# Altium footprint library TranDangKhoa-LIB.PcbLib: 1435 footprints (part 57 of 90)
Each footprint in its own frame and in the unit in brackets; x right, y up, seen from the top. Pads: shape width x height; smd on the part's side, far side on the other; paste and mask are expansions set on the pad; w line width, h text height; cw(c..) or ccw(c..) is an arc to the next point about the centre after c.
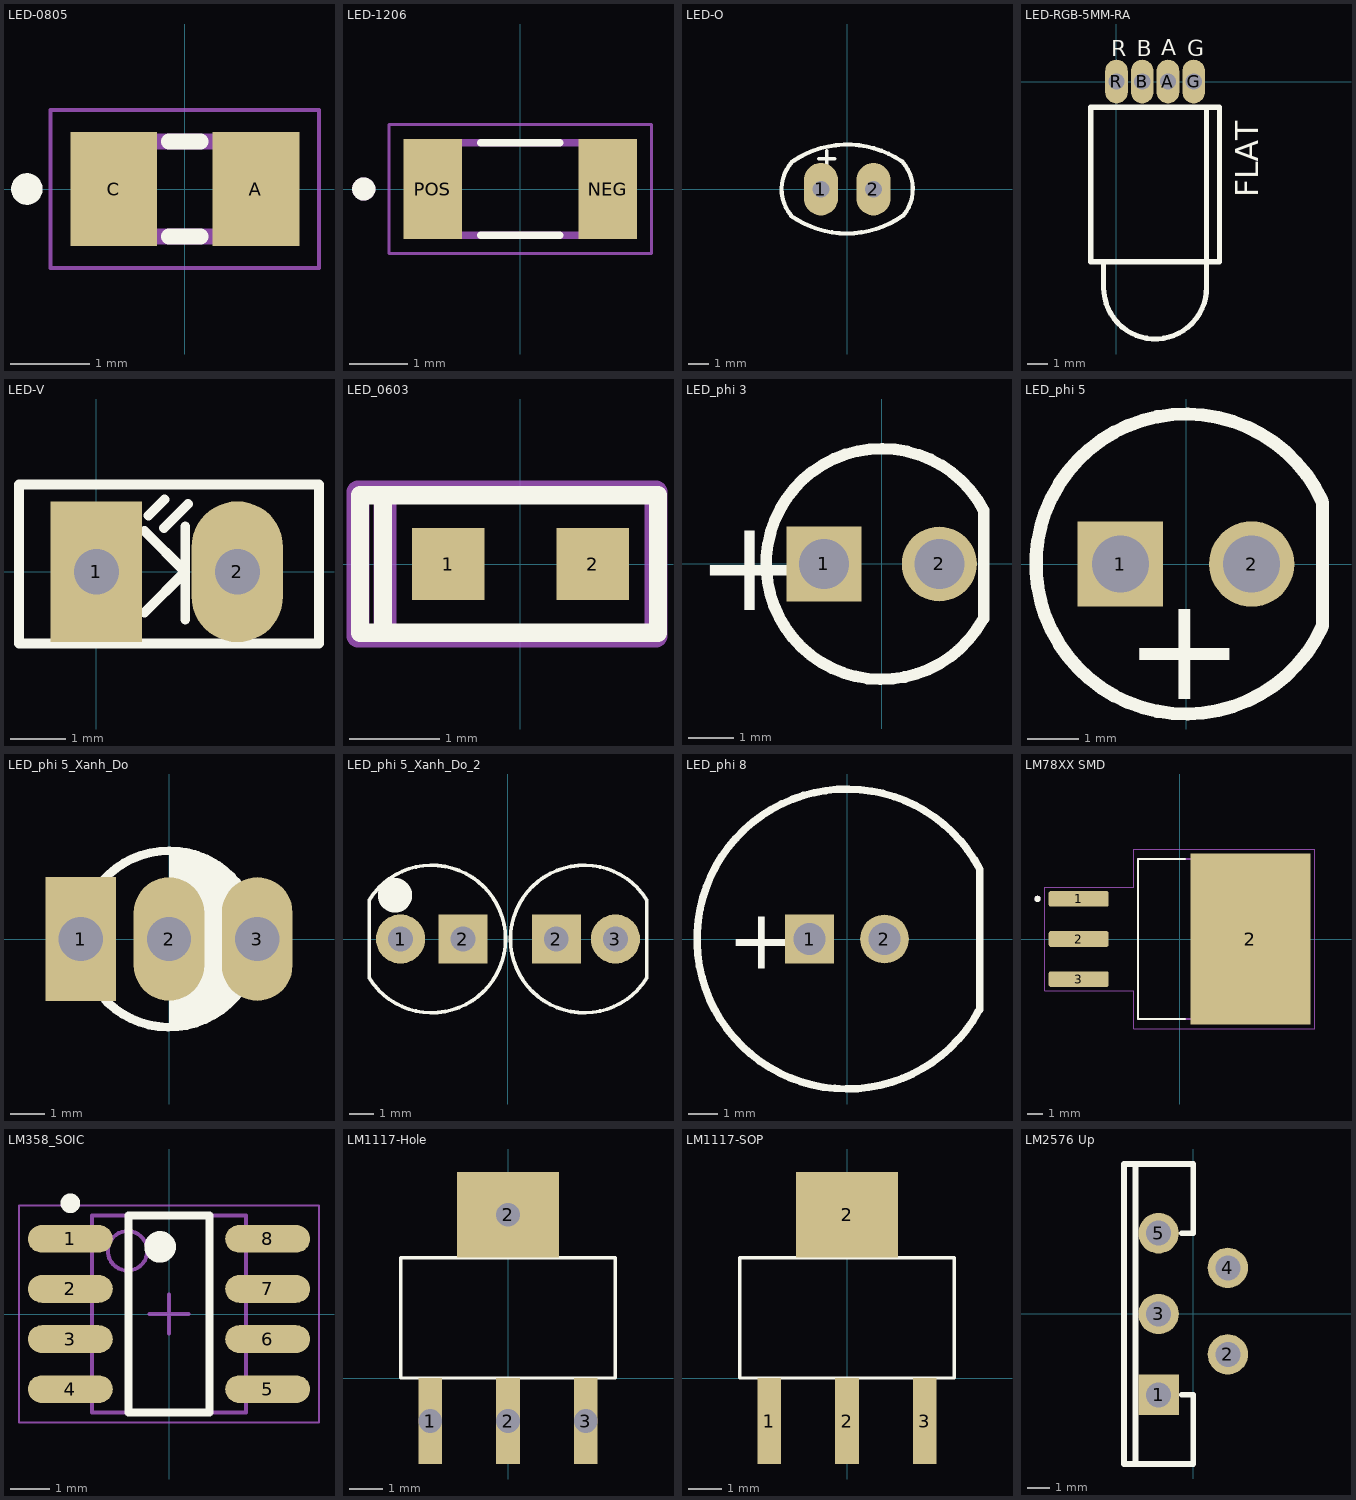
[diagram p56: the footprints below, top view; thin cyan lines are the x and y axes]

## LED-0805 [mm]
pads (2):
  rect 1.1x1.45 smd: A(0.9,0) C(-0.9,0)
Top Overlay:
  circle w0.2: c-2,0 r0.1
  lines w0.2: -0.2,-0.6 0.2,-0.6 ; -0.2,0.6 0.2,0.6
Mechanical 13:
  region: 1,-0.6 0.5,-0.6 0.5,0.6 1,0.6
  region: -0.5,-0.6 -1,-0.6 -1,0.6 -0.5,0.6
  lines w0.2: -1,-0.6 -1,0.6 1,0.6 1,-0.6 -1,-0.6
Mechanical 15:
  lines w0.05: -1.7,-1 -1.7,1 1.7,1 1.7,-1 -1.7,-1
3D body "step_temp.STEP": height 0.9, standoff 0, extent -1,-0.65 1,0.65

## LED-1206 [mm]
height 1.2
pads (2):
  rect 1.01x1.73 smd: NEG(1.51,0) POS(-1.51,0)
Top Overlay:
  circle w0.2: c-2.7,0 r0.1
  lines w0.127: -0.685,-0.8 0.685,-0.8 ; -0.685,0.8 0.685,0.8
Mechanical 13:
  circle w0.2: c-2.7,0 r0.1
  lines w0.127: -1.6,-0.8 1.6,-0.8 1.6,0.8 -1.6,0.8 -1.6,-0.8
Mechanical 15:
  lines w0.05: -2.265,-1.115 2.265,-1.115 2.265,1.115 -2.265,1.115 -2.265,-1.115
3D body "step_temp.STEP": height 1.2, standoff 0, extent -1.6,-0.8 1.6,0.8

## LED-O [mil] "LED 2 PIN,  Ovan Only colour, pin to pin 110mil"
height 300
pads (2):
  oval 65x100 hole 32: 1(-50,0) 2(50,0)
Top Overlay:
  lines w7: -54,58 -24,58 ; -39,43 -39,73
  lines w8: -106.82,-49.85 cw(c-47,0) -104.5,52.5 ; -106.38,-51.11 ccw(c-0.81,100.81) 104.97,-50.96 ; -102.83,53.79 cw(c0,-100) 103.93,53.04 ; 104.5,52.5 cw(c47,0) 106.82,-49.85

## LED-RGB-5MM-RA [mil] "LED RGB Right Angle 5mm"
height 5
pads (4):
  oval 44x85 hole 31.5 paste-99999 mask+0: A(100,0) B(50,0) G(150,0) R(0,0)
Top Overlay:
  lines w10: -25,-350 -25,-400 ccw(c75,-400) 175,-400 175,-350 175,-50 ; -50,-350 200,-350 200,-50 -50,-50 -50,-350
  text "G" at 137.8,49.21 h31.5
  text "A" at 86.61,51.18 h31.5
  text "FLAT" at 275,-225 h45
  text "R" at -9.84,49.21 h31.5
  text "B" at 39.37,49.21 h31.5

## LED-V [mil] "LED 2 PIN, Rectang Only colour"
height 300
pads (2):
  rect 65x100 hole 32: 1(0,0)
  oval 65x100 hole 32: 2(100,0)
Top Overlay:
  lines w7: 34,-29 63,0 34,29 ; 37,40 48.3,51.3 ; 48,31 65,48 ; 63,-34 63,32 ; -55,-51 -55,62 158,62 158,-51 -55,-51

## LED_0603 [mm]
pads (2):
  rect 0.8x0.8 smd: 1(-0.8,0) 2(0.8,0)
Top Overlay:
  lines w0.2: -1.524,-0.762 -1.524,0.762 ; -1.778,-0.762 -1.778,0.762 1.524,0.762 1.524,-0.762 -1.778,-0.762
Mechanical 16:
  lines w0.254: -1.5,-0.8 -1.5,0.8 ; -1.8,-0.8 1.5,-0.8 1.5,0.8 -1.8,0.8 -1.8,-0.8
Mechanical 29:
  text ".Designator" at 0.5,0.3 h0.6
3D body: height 0.66, standoff 0.5, extent -0.2,-0.2 0.2,0.2
3D body "LED SMD 0603.step": height 0.65, standoff 0, extent -0.85,-0.4 0.85,0.4

## LED_phi 3 [mil] "LED phi 3"
height 236.22
pads (2):
  rect 65x65 hole 43.31: 1(-50,0)
  round 65 hole 43.31: 2(50,0)
Top Overlay:
  lines w10: 87.62,-48.19 cw(c0,0) 88.49,46.58 88.49,-47.32
  text "+" at -160,-40 h80

## LED_phi 5 [mil] "LED phi 5mm"
height 649.61
pads (2):
  rect 65x65 hole 43.31: 1(-50,0)
  round 65 hole 43.31: 2(50,0)
Top Overlay:
  lines w10: 103.49,-48.23 cw(c0,0) 103.49,48.23 ; 104,-47 104,46.9
  text "+" at -47,-103 h80

## LED_phi 5_Xanh_Do [mil] "LED phi 5mm 2 mau xanh va do"
height 314.96
pads (3):
  rect 80x140 hole 50: 1(-100,0)
  oval 80x140 hole 50: 2(0,0) 3(100,0)
Top Overlay:
  region: 0,100 7,93 27,93
  region: 0,100 0,-100 25,-100 35,-90 50,-90 87.62,-52.38 87.62,45.71 88.49,46.58 88.49,51.51 70.71,69.29 70.71,70.71 69.29,70.71 47,93 7,93
  lines w10: 0,100 cw(c0,0) 70.71,70.71 ; 87.62,-48.19 cw(c0,0) 88.49,46.58 88.49,-47.32

## LED_phi 5_Xanh_Do_2 [mm] "LED phi 5mm 2 mau xanh va do doc lap"
height 8
pads (4):
  round 2 hole 1: 1(-4.37,0) 3(4.37,0)
  rect 2x2 hole 1: 2(-1.83,0) 2(1.97,0)
Top Overlay:
  circle w1: c-4.594,1.778 r0.2
  lines w0.15: -5.64,-1.6 -5.64,1.575 ; -5.638,-1.599 ccw(c-3.1,0) -5.638,1.599 ; 5.638,-1.575 5.638,1.6 ; 5.638,-1.599 cw(c3.1,0) 5.638,1.599

## LED_phi 8 [mil] "LED phi 8mm"
height 649.61
pads (2):
  rect 65x65 hole 43.31: 1(-50,0)
  round 65 hole 43.31: 2(50,0)
Top Overlay:
  lines w10: 175.24,-96.38 cw(c0,0) 176.98,93.15 176.98,-94.64
  text "+" at -160,-40 h80

## LM78XX SMD [mm]
pads (4):
  rrect25% 3.79x0.99 smd: 1(-6.4,2.54) 2(-6.4,0) 3(-6.4,-2.54)
  rect 7.62x10.84 smd paste-6: 2(4.48,0)
Top Overlay:
  circle w0.2: c-9,2.54 r0.1
  lines w0.127: 0.35,-5.08 -2.648,-5.08 -2.648,5.08 0.35,5.08
Top Paste:
  region: 5.205,0.27 3.755,0.27 3.755,1.53 5.205,1.53
  region: 5.205,2.07 3.755,2.07 3.755,3.33 5.205,3.33
  region: 5.205,3.87 3.755,3.87 3.755,5.13 5.205,5.13
  region: 5.205,-1.53 3.755,-1.53 3.755,-0.27 5.205,-0.27
  region: 5.205,-3.33 3.755,-3.33 3.755,-2.07 5.205,-2.07
  region: 5.205,-5.13 3.755,-5.13 3.755,-3.87 5.205,-3.87
  region: 7.745,0.27 6.295,0.27 6.295,1.53 7.745,1.53
  region: 7.745,2.07 6.295,2.07 6.295,3.33 7.745,3.33
  region: 7.745,3.87 6.295,3.87 6.295,5.13 7.745,5.13
  region: 7.745,-1.53 6.295,-1.53 6.295,-0.27 7.745,-0.27
  region: 7.745,-3.33 6.295,-3.33 6.295,-2.07 7.745,-2.07
  region: 7.745,-5.13 6.295,-5.13 6.295,-3.87 7.745,-3.87
  region: 2.665,0.27 1.215,0.27 1.215,1.53 2.665,1.53
  region: 2.665,2.07 1.215,2.07 1.215,3.33 2.665,3.33
  region: 2.665,3.87 1.215,3.87 1.215,5.13 2.665,5.13
  region: 2.665,-1.53 1.215,-1.53 1.215,-0.27 2.665,-0.27
  region: 2.665,-3.33 1.215,-3.33 1.215,-2.07 2.665,-2.07
  region: 2.665,-5.13 1.215,-5.13 1.215,-3.87 2.665,-3.87
Mechanical 13:
  circle w0.2: c-9,2.54 r0.1
  lines w0.127: -2.648,-5.08 6.373,-5.08 6.373,5.08 -2.648,5.08 -2.648,-5.08
Mechanical 15:
  lines w0.05: -8.545,-3.285 -8.545,3.285 -2.898,3.285 -2.898,5.67 8.54,5.67 8.54,-5.67 -2.898,-5.67 -2.898,-3.285 -8.545,-3.285
3D body "step_temp.STEP": height 4.83, standoff -0.25, extent -7.62,-5.08 7.62,5.08

## LM358_SOIC [mm] "SOIC, 8-Leads, Body 5.00x3.90mm, Pitch 1.27mm, IPC Medium Density"
height 1.75
pads (8):
  oval 2.15x0.7 smd: 1(-2.5,1.905) 2(-2.5,0.635) 3(-2.5,-0.635) 4(-2.5,-1.905) 5(2.5,-1.905) 6(2.5,-0.635) 7(2.5,0.635) 8(2.5,1.905)
Top Overlay:
  circle w0.25: c-2.5,2.805 r0.125
  circle w0.4: c-0.225,1.7 r0.2
  lines w0.2: -1.025,-2.5 -1.025,2.5 1.025,2.5 1.025,-2.5 -1.025,-2.5
Mechanical 13:
  circle w0.1: c-1.05,1.6 r0.5
  lines w0.1: -1.95,-2.5 -1.95,2.5 1.95,2.5 1.95,-2.5 -1.95,-2.5
Mechanical 15:
  lines w0.05: -3.8,-2.75 -3.8,2.75 3.8,2.75 3.8,-2.75 -3.8,-2.75
  lines w0.1: -0.5,0 0.5,0 ; 0,-0.5 0,0.5
3D body: height 1.75, standoff 1.75, extent -1.95,-2.5 1.95,2.5

## LM1117-Hole [mm]
pads (4):
  rect 0.7x2.54 hole 0.7: 1(-2.3,-1.27) 2(0,-1.27) 3(2.3,-1.27)
  rect 3x2.54 hole 0.7: 2(0,4.826)
Top Overlay:
  lines w0.1: -3.175,0 -3.175,3.556 3.175,3.556 3.175,0 -3.175,0
3D body "SW3DPS-SOT-223-DEFAULT.step": height 1.68, standoff 0, extent -3.25,-1.702 3.25,5.258

## LM1117-SOP [mm]
pads (4):
  rect 0.7x2.54 smd: 1(-2.3,-1.27) 2(0,-1.27) 3(2.3,-1.27)
  rect 3x2.54 smd: 2(0,4.826)
Top Overlay:
  lines w0.1: -3.175,0 -3.175,3.556 3.175,3.556 3.175,0 -3.175,0
3D body "SW3DPS-SOT-223-DEFAULT.step": height 1.68, standoff 0, extent -3.25,-1.778 3.25,5.182

## LM2576 Up [mil] "IC nguon LM2576"
pads (5):
  rect 70x70 hole 43.31: 1(-60,-140)
  round 70 hole 43.31: 2(60,-70) 3(-60,0) 4(60,80) 5(-60,140)
Top Overlay:
  lines w10: -100,-260 -100,260 ; -20,-140 0,-140 0,-260 -120,-260 -120,260 0,260 0,140 -20,140